# Altium footprint library BRT_Components.PcbLib: 132 footprints (part 9 of 9)
Each footprint in its own frame and in the unit in brackets; x right, y up, seen from the top. Pads: shape width x height; smd on the part's side, far side on the other; paste and mask are expansions set on the pad; w line width, h text height; cw(c..) or ccw(c..) is an arc to the next point about the centre after c.
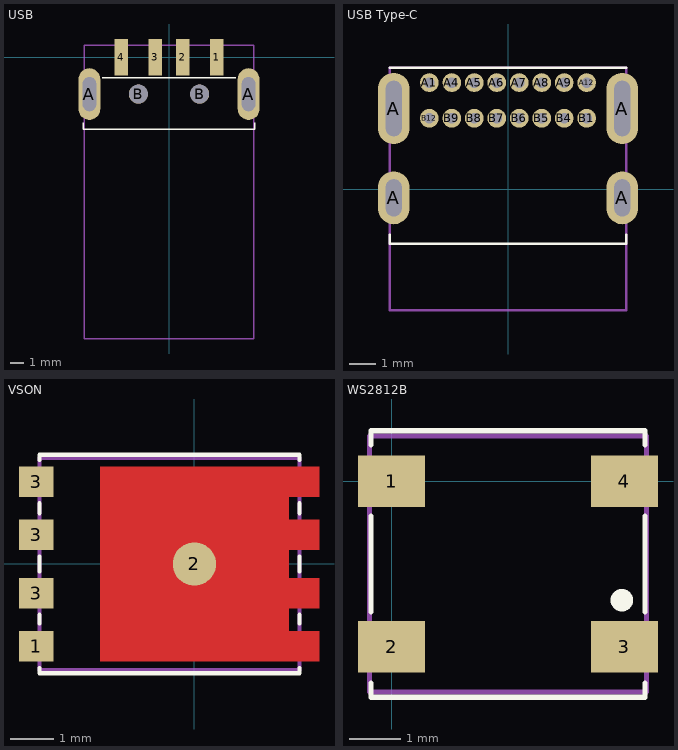
[diagram p8: the footprints below, top view; thin cyan lines are the x and y axes]

## USB [mm]
pads (8):
  rect 1x2.7 smd: 1(3.5,0) 2(1,0) 3(-1,0) 4(-3.5,0)
  oval 1.6x3.8 hole 2.5 slot 1 at 0 deg: A(-5.85,-2.7) A(5.85,-2.7)
  round 1.4 hole 1.4: B(-2.25,-2.7) B(2.25,-2.7)
Top Overlay:
  lines w0.1: -6.3,-4.8 -6.3,-5.3 6.3,-5.3 6.3,-4.8 ; -4.9,-1.5 4.9,-1.5
Mechanical 13:
  lines w0.1: -6.214,-20.702 6.214,-20.702 6.214,0.9 -6.214,0.9 -6.214,-20.702
3D body "User Library-USB 2_0 Type A Male v2.step": height 4.5, standoff -2.5, extent -6.214,-20.702 6.214,0.9

## USB Type-C [mm]
pads (20):
  oval 1.2x2 hole 0.6 slot 1.4 at 90 deg: A(-4.325,-0.335) A(4.325,-0.335)
  oval 1.2x2.7 hole 0.6 slot 2.1 at 90 deg: A(-4.325,3.045) A(4.325,3.045)
  round 0.71 hole 0.4 mask+0.15: A1(-2.975,4.025) A4(-2.125,4.025) A5(-1.275,4.025) A6(-0.425,4.025) A7(0.425,4.025) A8(1.275,4.025) A9(2.125,4.025) A12(2.975,4.025) B1(2.975,2.675) B4(2.125,2.675) B5(1.275,2.675) B6(0.425,2.675) B7(-0.425,2.675) B8(-1.275,2.675) B9(-2.125,2.675) B12(-2.975,2.675)
Top Overlay:
  lines w0.1: -4.475,-1.725 -4.475,-2.075 4.475,-2.075 4.475,-1.725 ; -4.475,4.585 4.475,4.585
Mechanical 13:
  lines w0.1: -4.475,-4.585 4.475,-4.585 4.475,4.585 -4.475,4.585 -4.475,-4.585
3D body "USB4085-03-A_revA.STEP": height 3.46, standoff -2.1, extent -4.515,-4.564 4.515,4.606

## VSON [mm]
pads (5):
  rect 0.8x0.7 smd: 1(-3.65,-1.9) 3(-3.65,-0.675) 3(-3.65,0.675) 3(-3.65,1.9)
  round 1 smd: 2(0,0)
Top Layer:
  region: 2.175,-1.55 2.175,-1.025 2.875,-1.025 2.875,-0.325 2.175,-0.325 2.175,0.325 2.875,0.325 2.875,1.025 2.175,1.025 2.175,1.55 2.875,1.55 2.875,2.25 -2.175,2.25 -2.175,-2.25 2.875,-2.25 2.875,-1.55
Top Overlay:
  lines w0.1: -3.575,-2.4 -3.575,-2.525 2.425,-2.525 2.425,-2.4 ; -3.575,-1.375 -3.575,-1.175 ; -3.575,-0.175 -3.575,0.175 ; -3.575,1.175 -3.575,1.4 ; -3.575,2.4 -3.575,2.525 2.425,2.525 2.425,2.4 ; 2.425,-1.375 2.425,-1.175 ; 2.425,-0.175 2.425,0.175 ; 2.425,1.175 2.425,1.4
Mechanical 13:
  lines w0.1: -3.575,-2.45 2.425,-2.45 2.425,2.45 -3.575,2.45 -3.575,-2.45
3D body "User Library-8-VSON 5x6.STEP": height 1, standoff 0, extent -3.575,-2.45 2.425,2.45

## WS2812B [mm]
pads (4):
  rect 1.3x1 smd: 1(0,0) 2(0,-3.2) 3(4.5,-3.2) 4(4.5,0)
Top Overlay:
  circle w0.254: c4.45,-2.3 r0.09
  lines w0.1: -0.4,-3.9 -0.4,-4.175 4.9,-4.175 4.9,-3.9 ; -0.4,-2.525 -0.4,-0.675 ; -0.4,0.7 -0.4,0.975 4.9,0.975 4.9,0.7 ; 4.9,-2.525 4.9,-0.675
Mechanical 13:
  lines w0.1: -0.425,-4.075 -0.425,0.875 4.925,0.875 4.925,-4.075 -0.425,-4.075
3D body "WS2812_RGB_LED_updated.stp": height 1.7, standoff 0, extent -0.425,-4.075 4.925,0.875